# Altium footprint library 8-Crystals.PcbLib: 104 footprints (part 7 of 7)
Each footprint in its own frame and in the unit in brackets; x right, y up, seen from the top. Pads: shape width x height; smd on the part's side, far side on the other; paste and mask are expansions set on the pad; w line width, h text height; cw(c..) or ccw(c..) is an arc to the next point about the centre after c.
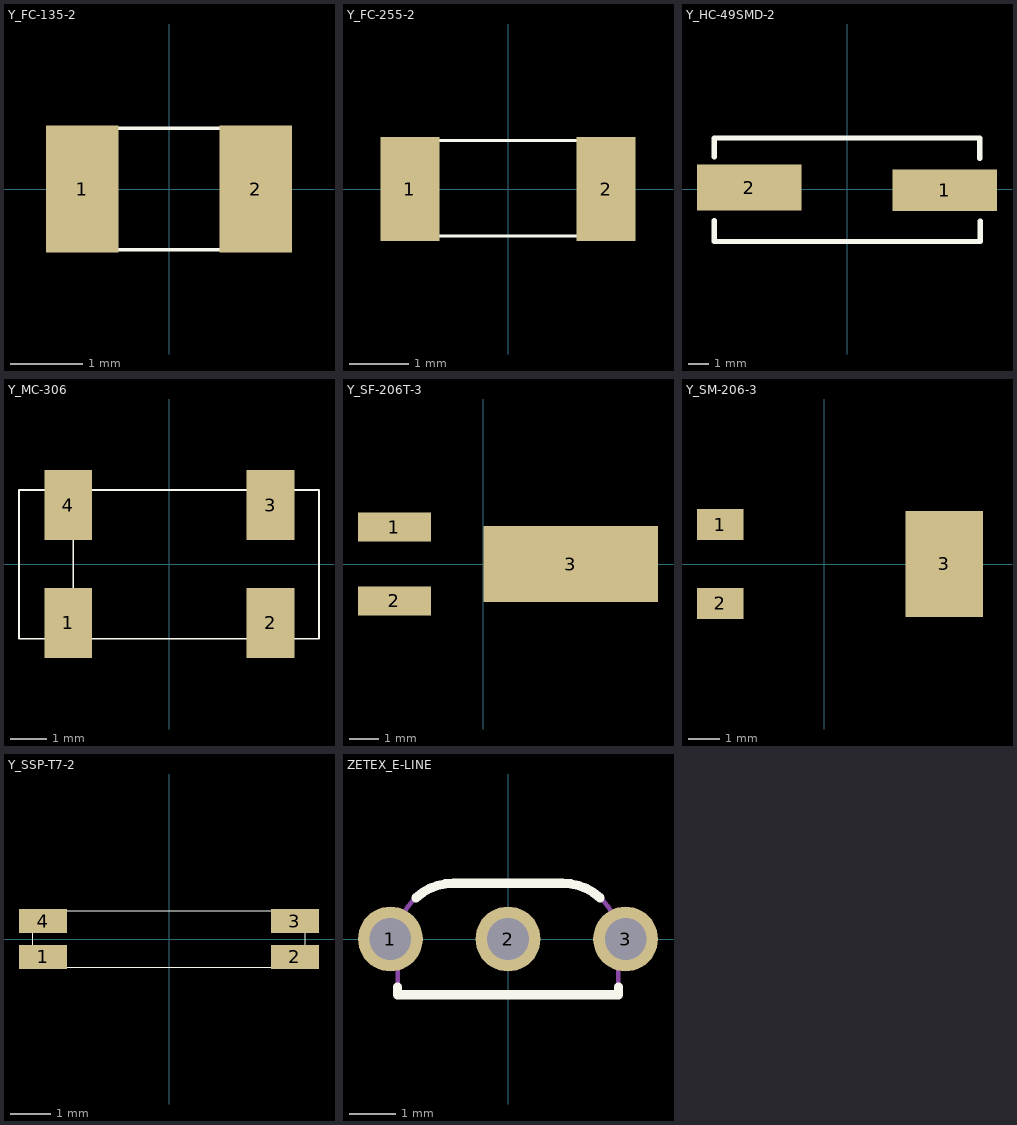
[diagram p6: the footprints below, top view; thin cyan lines are the x and y axes]

## Y_FC-135-2 [mm] "3215"
height 8.78
pads (2):
  rect 1x1.75 smd: 1(-1.2,0) 2(1.2,0)
Top Overlay:
  lines w0.051: -1.651,-0.838 1.651,-0.838 1.651,0.838 -1.651,0.838 -1.651,-0.838
3D body "Y_fc135-2.stp": height 0.71, standoff 0, extent -1.6,-0.787 1.6,0.793
3D body "p175-100.stp": height 0.02, standoff 0, extent -1.7,-0.875 -0.7,0.875
3D body "p175-100.stp": height 0.02, standoff 0, extent 0.7,-0.875 1.7,0.875

## Y_FC-255-2 [mm]
height 8.78
pads (2):
  rect 1x1.75 smd: 1(-1.65,0) 2(1.65,0)
Top Overlay:
  lines w0.051: -2.108,-0.787 -2.108,0.813 2.108,0.813 2.108,-0.787 -2.108,-0.787
3D body "y_fc-225.stp": height 0.75, standoff 0, extent -2.057,-0.737 2.043,0.763
3D body "p175-100.stp": height 0.02, standoff 0, extent -2.151,-0.875 -1.151,0.875
3D body "p175-100.stp": height 0.02, standoff 0, extent 1.151,-0.875 2.151,0.875

## Y_HC-49SMD-2 [mm]
height 8.78
pads (2):
  rect 5x2 smd: 1(4.675,-0.062)
  rect 5x2.2 smd: 2(-4.675,0.062)
Top Overlay:
  lines w0.254: -6.35,-1.512 -6.35,-2.515 6.375,-2.515 6.375,-1.538 ; -6.35,1.536 -6.35,2.438 6.35,2.438 6.35,1.459
3D body "hc-49smd.stp": height 4.3, standoff 0, extent -6.15,-2.286 6.15,2.214
3D body "p500-220.stp": height 0.02, standoff 0, extent -7.175,-1.037 -2.175,1.163
3D body "p500-220.stp": height 0.02, standoff 0, extent 2.175,-1.162 7.175,1.038

## Y_MC-306 [mm]
height 8.78
pads (4):
  rect 1.3x1.9 smd mask+0.051: 1(-2.75,-1.6) 2(2.75,-1.6) 3(2.75,1.6) 4(-2.75,1.6)
Top Overlay:
  lines w0.051: -2.616,-2.032 -2.616,2.007 ; -4.089,-2.032 -4.089,2.007 4.064,2.007 4.064,-2.032 -4.089,-2.032
3D body "p190-130.stp": height 0.02, standoff 0, extent 2.1,-2.55 3.4,-0.65
3D body "p190-130.stp": height 0.02, standoff 0, extent -3.4,-2.55 -2.1,-0.65
3D body "p190-130.stp": height 0.02, standoff 0, extent 2.1,0.65 3.4,2.55
3D body "p190-130.stp": height 0.02, standoff 0, extent -3.4,0.65 -2.1,2.55
3D body "y_mc-306.stp": height 2.4, standoff 0, extent -4,-1.956 4,1.944

## Y_SF-206T-3 [mm]
height 8.78
pads (3):
  rect 2.5x1 smd mask+0.051: 1(-3.048,1.27) 2(-3.048,-1.27)
  rect 6x2.6 smd mask+0.051: 3(3.006,0)
3D body "p600-260.stp": height 0.02, standoff 0, extent 0.007,-1.3 6.007,1.3
3D body "pxxx-xxx.stp": height 0.02, standoff 0, extent -4.318,-1.762 -1.818,-0.762
3D body "pxxx-xxx.stp": height 0.02, standoff 0, extent -4.318,0.762 -1.818,1.762
3D body "y_sf-206.stp": height 2, standoff 0, extent -3.836,-1.346 5.664,1.354

## Y_SM-206-3 [mm]
height 8.78
pads (3):
  rect 1.5x1 smd mask+0.051: 1(-3.35,1.27) 2(-3.35,-1.27)
  rect 2.5x3.4 smd mask+0.051: 3(3.85,0)
3D body "y_sm-206.stp": height 2.11, standoff 0, extent -3.759,-1.295 4.941,1.404
3D body "p155-100.stp": height 0.02, standoff 0, extent -4.125,0.77 -2.575,1.77
3D body "p155-100.stp": height 0.02, standoff 0, extent -4.125,-1.77 -2.575,-0.77
3D body "p340-250.stp": height 0.02, standoff 0, extent 2.6,-1.7 5.1,1.7

## Y_SSP-T7-2 [mm]
height 8.78
pads (4):
  rect 1.2x0.6 smd mask+0.051: 1(-3.15,-0.45) 2(3.15,-0.45) 3(3.15,0.45) 4(-3.15,0.45)
Top Overlay:
  lines w0.01: -3.4,-0.58 -3.58,-0.58 -3.58,-0.34 -3.4,-0.34 ; -3.4,-0.43 -3.13,-0.7 ; -3.4,0.32 -3.58,0.32 -3.58,0.56 -3.4,0.56 ; -3.4,0.43 -3.13,0.7 ; 3.13,-0.7 3.4,-0.43 ; 3.13,0.7 3.4,0.43 ; 3.4,-0.57 3.58,-0.57 3.58,-0.33 3.4,-0.33 ; 3.4,0.31 3.58,0.31 3.58,0.55 3.4,0.55
  lines w0.02: -3.4,-0.7 3.4,-0.7 3.4,0.7 -3.4,0.7 -3.4,-0.7
3D body "p120-060.stp": height 0.02, standoff 0, extent 2.55,-0.75 3.75,-0.15
3D body "p120-060.stp": height 0.02, standoff 0, extent 2.55,0.15 3.75,0.75
3D body "p120-060.stp": height 0.02, standoff 0, extent -3.75,-0.75 -2.55,-0.15
3D body "p120-060.stp": height 0.02, standoff 0, extent -3.75,0.15 -2.55,0.75
3D body "ssp-t7.stp": height 1.4, standoff 0, extent -3.495,-0.75 3.505,0.75

## ZETEX_E-LINE [mm] "E-Line Case, Pitch 2.54mm, Flat Index, 3 In-Line, Bent Leads, Body 4.57mm x 2.28mm"
height 8.78
pads (3):
  round 1.4 hole 0.9: 1(-2.54,0) 2(0,0) 3(2.54,0)
Top Overlay:
  lines w0.2: -2.385,-1.038 -2.385,-1.205 2.385,-1.205 2.385,-1.038 ; -1.989,0.894 cw(c-1.18,0) -1.18,1.205 1.18,1.205 cw(c1.18,0) 1.989,0.894
Mechanical 8:
  lines w0.1: -3.04,0 -2.54,0 ; -2.54,-0.5 -2.54,0 ; -2.54,0.5 -2.54,0 ; -2.04,0 -2.54,0 ; -0.5,0 0,0 ; 0,-0.5 0,0 ; 0,0.5 0,0 ; 0.5,0 0,0 ; 2.04,0 2.54,0 ; 2.54,-0.5 2.54,0 ; 2.54,0.5 2.54,0 ; 3.04,0 2.54,0
Mechanical 14:
  lines w0.1: -2.385,-0.225 -2.765,-0.225 -2.765,0.225 -2.364,0.225 ; 2.364,0.225 2.765,0.225 2.765,-0.225 2.385,-0.225 ; -2.385,-1.205 2.385,-1.205 2.385,0 ccw(c1.18,0) 1.18,1.205 -1.18,1.205 ccw(c-1.18,0) -2.385,0 -2.385,-1.205
3D body "ZETEX_E-LINE.stp": height 8.01, standoff -3.2, extent -2.765,-1.205 2.765,1.205
3D body "v140-090.stp": height 0.02, standoff -1.65, extent -3.24,-0.7 -1.84,0.7
3D body "v140-090.stp": height 0.02, standoff -1.65, extent -0.7,-0.7 0.7,0.7
3D body "v140-090.stp": height 0.02, standoff -1.65, extent 1.84,-0.7 3.24,0.7